# Altium footprint library Team Starcraft.PcbLib: 62 footprints (part 3 of 4)
Each footprint in its own frame and in the unit in brackets; x right, y up, seen from the top. Pads: shape width x height; smd on the part's side, far side on the other; paste and mask are expansions set on the pad; w line width, h text height; cw(c..) or ccw(c..) is an arc to the next point about the centre after c.
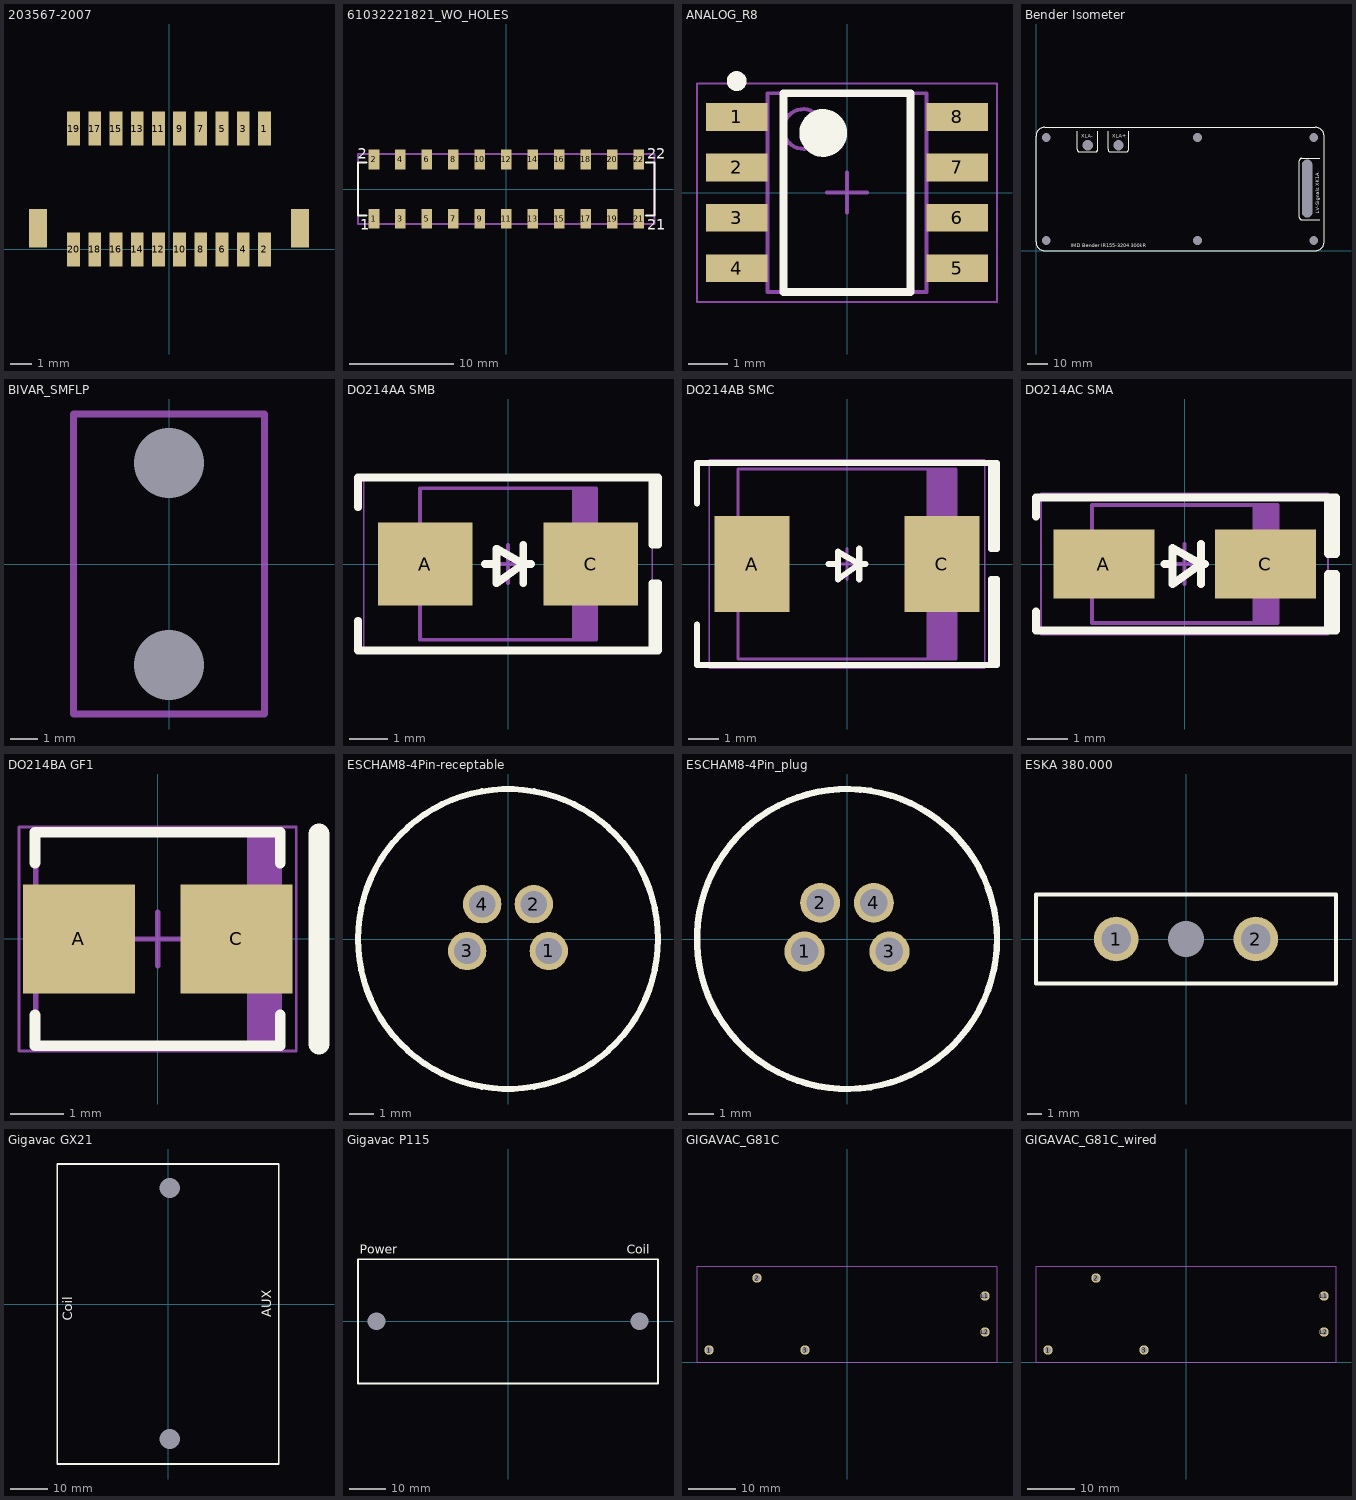
[diagram p2: the footprints below, top view; thin cyan lines are the x and y axes]

## 203567-2007 [mm] "1.00mm Pitch Pico-Clasp Wire-to-Board Header, Surface Mount, Dual Row, Right-Angle, 0.76µm Gold Plated, with Inner Positive Lock, 20 Circuits"
height 8.25
pads (22):
  rect 0.6x1.6 smd: 1(4.5,5.7) 2(4.5,0) 3(3.5,5.7) 4(3.5,0) 5(2.5,5.7) 6(2.5,0) 7(1.5,5.7) 8(1.5,0) 9(0.5,5.7) 10(0.5,0) 11(-0.5,5.7) 12(-0.5,0) 13(-1.5,5.7) 14(-1.5,0) 15(-2.5,5.7) 16(-2.5,0) 17(-3.5,5.7) 18(-3.5,0) 19(-4.5,5.7) 20(-4.5,0)
  rect 0.85x1.8 smd: ""(-6.175,1) ""(6.175,1)
3D body "2035672007.stp": height 8.23, standoff -0.02, extent -6.5,-0.45 6.5,6.05

## 61032221821_WO_HOLES [mm] "Dual SMT Socket Header, pitch 2.54mm, 22p, without holes"
height 7.45
pads (22):
  rect 1.02x1.9 smd: 1(-12.7,-2.85) 2(-12.7,2.85) 3(-10.16,-2.85) 4(-10.16,2.85) 5(-7.62,-2.85) 6(-7.62,2.85) 7(-5.08,-2.85) 8(-5.08,2.85) 9(-2.54,-2.85) 10(-2.54,2.85) 11(0,-2.85) 12(0,2.85) 13(2.54,-2.85) 14(2.54,2.85) 15(5.08,-2.85) 16(5.08,2.85) 17(7.62,-2.85) 18(7.62,2.85) 19(10.16,-2.85) 20(10.16,2.85) 21(12.7,-2.85) 22(12.7,2.85)
Top Overlay:
  lines w0.2: -13.41,-2.54 -14.22,-2.54 -14.22,2.54 -13.41,2.54 ; 13.41,-2.54 14.22,-2.54 14.22,2.54 13.41,2.54
  text "2" at -14.23,2.9 h1.02
  text "1" at -14.03,-3.9 h1.02
  text "21" at 13.53,-3.9 h1.02
  text "22" at 13.53,2.9 h1.02
Mechanical 13:
  lines w0.2: -14.22,-3.35 -14.22,3.35 14.22,3.35 14.22,-3.35 -14.22,-3.35
3D body "61032221821.stp": height 8.52, standoff 0.02, extent -13.97,-3.35 13.97,3.35

## ANALOG_R8 [mm] "Analog Devices 8-Lead Standard Small Outline Package [SOIC_N]"
height 1.75
pads (8):
  rect 1.55x0.7 smd: 1(-2.775,1.905) 2(-2.775,0.635) 3(-2.775,-0.635) 4(-2.775,-1.905) 5(2.775,-1.905) 6(2.775,-0.635) 7(2.775,0.635) 8(2.775,1.905)
Top Overlay:
  circle w0.6: c-0.6,1.5 r0.3
  circle w0.25: c-2.775,2.805 r0.125
  lines w0.2: -1.6,-2.5 1.6,-2.5 1.6,2.5 -1.6,2.5 -1.6,-2.5
Mechanical 13:
  circle w0.1: c-1.1,1.6 r0.5
  lines w0.1: -2,-2.5 2,-2.5 2,2.5 -2,2.5 -2,-2.5
Mechanical 15:
  lines w0.05: -3.775,-2.75 3.775,-2.75 3.775,2.75 -3.775,2.75 -3.775,-2.75
  lines w0.1: -0.5,0 0.5,0 ; 0,-0.5 0,0.5
3D body "SOIC8 CAN-Transciever.step": height 1.75, standoff 0, extent -3.1,-2.5 3.1,2.5

## Bender Isometer [mm] "Placeholder for Bender Isometer"
pads (9):
  round 1.524 hole 4.2 unplated: ""(5,5) ""(5,55) ""(78.5,5) ""(78.5,55) ""(135,5) ""(135,55)
  round 1.524 hole 5 square unplated: ""(25.1,51.3) ""(40.1,51.3)
  round 1.524 hole 5 slot 28 at 90 deg unplated: ""(131.8,30.2)
Top Overlay:
  lines w0.254: 0,55.768 cw(c4.232,55.768) 4.232,60 135.732,60 cw(c135.732,55.732) 140,55.732 140,4.268 cw(c135.732,4.268) 135.732,0 4.268,0 cw(c4.268,4.268) 0,4.268 0,47.5 0,55.732 cw(c4.268,55.732) 4.268,60 10,60 ; 20,58 20,49.27 ccw(c21.27,49.27) 21.27,48 28.73,48 ccw(c28.73,49.27) 30,49.27 30,58 ; 35,58 35,49.27 ccw(c36.27,49.27) 36.27,48 43.73,48 ccw(c43.73,49.27) 45,49.27 45,58 ; 138,15 129.27,15 cw(c129.27,16.27) 128,16.27 128,43.73 cw(c129.27,43.73) 129.27,45 138,45
  text "IMD Bender IR155-3204 300kR" at 17,1.7 h1.75
  text "XLA+" at 37,55 h1.75
  text "XLA-" at 22,55 h1.75
  text "LV-Signals XK1A" at 137.6,18 h1.75
3D body "TSC-5E-70127-PCB-IMD.stp": height -7, standoff -20, extent 0,0 143,60
3D body: height 13, standoff 0, extent 124,-5.5 124,-5.5
3D body: height 13, standoff 0, extent 124,-6.5 124,-6.5

## BIVAR_SMFLP [mm] "SMD flexible lightpipe"
height 34.3
pads (2):
  round 0 hole 2.565: ""(0,-3.7) ""(0,3.7)
Mechanical 15:
  lines w0.254: -3.5,-5.5 -3.5,5.5 3.5,5.5 3.5,-5.5 -3.5,-5.5
3D body "SMFLP_SOCKET.step": height 8.85, standoff -3.21, extent -3.492,-5.461 3.493,5.461

## DO214AA SMB [mm] "Molded Diode, 2-Leads, Body 4.31x3.62mm, IPC Medium Density"
height 2.44
pads (2):
  rect 2.45x2.15 smd: A(-2.15,0) C(2.15,0)
Top Overlay:
  lines w0.2: -3.9,-1.475 -3.9,-2.25 3.9,-2.25 3.9,-0.5 3.75,-0.5 3.75,-2.25 ; -3.9,1.475 -3.9,2.25 3.9,2.25 3.9,0.5 3.75,0.5 3.75,2.25 ; -0.6,0 -0.3,0 ; 0.4,-0.5 0.4,0.5 ; 0.6,0 0.4,0 ; 0.4,0 -0.3,-0.5 -0.3,0.4 0.4,0
Mechanical 13:
  rectangle: 1.67,-1.97 2.285,1.97
  lines w0.1: -2.285,-1.97 -2.285,1.97 2.285,1.97 2.285,-1.97 -2.285,-1.97
Mechanical 15:
  lines w0.05: -3.75,-2.25 -3.75,2.25 3.75,2.25 3.75,-2.25 -3.75,-2.25
  lines w0.1: -0.5,0 0.5,0 ; 0,-0.5 0,0.5
3D body "SMB.STEP": height 2.4, standoff 0, extent -2.6,-1.799 2.6,1.8

## DO214AB SMC [mm] "Molded Diode, 2-Leads, Body 6.85x5.90mm, IPC Medium Density"
height 2.62
pads (2):
  rect 2.45x3.15 smd: A(-3.1,0) C(3.1,0)
Top Overlay:
  lines w0.2: -4.9,-1.975 -4.9,-3.3 4.9,-3.3 4.9,-0.5 4.7,-0.5 4.7,-3.3 ; -4.9,1.975 -4.9,3.3 4.9,3.3 4.9,0.5 4.7,0.5 4.7,3.3 ; -0.6,0 -0.3,0 ; 0.4,-0.5 0.4,0.5 ; 0.6,0 0.4,0 ; 0.4,0 -0.3,-0.5 -0.3,0.4 0.4,0
Mechanical 13:
  rectangle: 2.599,-3.11 3.555,3.11
  lines w0.1: -3.555,-3.11 3.555,-3.11 3.555,3.11 -3.555,3.11 -3.555,-3.11
Mechanical 15:
  lines w0.05: -4.5,-3.4 4.5,-3.4 4.5,3.4 -4.5,3.4 -4.5,-3.4
  lines w0.1: -0.5,0 0.5,0 ; 0,-0.5 0,0.5
3D body "SMC.STEP": height 2.6, standoff 0, extent -3.97,-2.952 3.97,2.952

## DO214AC SMA [mm] "Molded Diode, 2-Leads, Body 4.30x2.60mm, IPC Medium Density"
height 2.4
pads (2):
  rect 2.5x1.7 smd: A(-2,0) C(2,0)
Top Overlay:
  lines w0.2: -3.683,-1.175 -3.683,-1.651 3.75,-1.651 3.75,-0.254 3.556,-0.254 3.556,-1.651 ; -3.683,1.175 -3.683,1.651 3.75,1.651 3.75,0.254 3.556,0.254 3.556,1.651 ; -0.5,0 -0.3,0 ; 0.4,-0.5 0.4,0.5 ; 0.5,0 0.4,0 ; 0.4,0 -0.3,0.4 -0.3,-0.5 0.4,0
Mechanical 13:
  rectangle: 1.681,-1.46 2.3,1.46
  lines w0.1: -2.3,-1.46 -2.3,1.46 2.3,1.46 2.3,-1.46 -2.3,-1.46
Mechanical 15:
  lines w0.05: -3.556,-1.75 -3.556,1.75 3.556,1.75 3.556,-1.75 -3.556,-1.75
  lines w0.1: -0.5,0 0.5,0 ; 0,-0.5 0,0.5
3D body "SMA.STEP": height 2.4, standoff 0, extent -2.6,-1.375 2.6,1.375

## DO214BA GF1 [mm] "Molded, 2-Leads, Body 4.57x3.94mm, IPC High Density"
height 3.3
pads (2):
  rect 2.1x2.05 smd: A(-1.475,0) C(1.475,0)
Top Overlay:
  lines w0.2: -2.3,-1.425 -2.3,-2 2.3,-2 2.3,-1.425 ; -2.3,1.425 -2.3,2 2.3,2 2.3,1.425
  lines w0.4: 3.025,-1.97 3.025,1.97
Mechanical 13:
  rectangle: 1.67,-1.97 2.285,1.97
  lines w0.1: -2.285,-1.97 -2.285,1.97 2.285,1.97 2.285,-1.97 -2.285,-1.97
Mechanical 15:
  lines w0.05: -2.6,-2.1 -2.6,2.1 2.6,2.1 2.6,-2.1 -2.6,-2.1
  lines w0.1: -0.5,0 0.5,0 ; 0,-0.5 0,0.5
3D body "DIOM4336X33L.step": height 3.3, standoff 0, extent -2.505,-1.97 2.505,1.97

## ESCHAM8-4Pin-receptable [mm]
height 18.8
pads (4):
  round 1.6 hole 1.1: 1(1.7,-0.5) 2(1.075,1.45) 3(-1.7,-0.5) 4(-1.075,1.45)
Top Overlay:
  circle w0.254: c0,0 r6.25
3D body "AL-FHM8KUA4P_M10.stp": height 2, standoff -16.8, extent -6,-6.25 6,6.25
3D body: height 0, standoff 0, extent -5.999,-5.999 5.999,5.999

## ESCHAM8-4Pin_plug [mm]
height 17.9
pads (4):
  round 1.6 hole 1.1: 1(-1.7,-0.5) 2(-1.075,1.45) 3(1.7,-0.5) 4(1.075,1.45)
Top Overlay:
  circle w0.254: c0,0 r6
3D body: height 0, standoff 0, extent -5.999,-5.999 5.999,5.999
3D body "AL-FHM8SUA4P_M8.stp": height 17.9, standoff -3, extent -6,-6.25 6,6.25

## ESKA 380.000 [mm] "Socket for automotive fuses"
height 27.6
pads (3):
  round 3 hole 2: 1(-4.7,0) 2(4.7,0)
  round 0 hole 2.4 unplated: ""(0,0)
Top Overlay:
  lines w0.254: -10.1,-3 10.1,-3 10.1,3 -10.1,3 -10.1,-3
3D body: height 21.1, standoff 0, extent -10.1,-3 10.1,3
3D body: height 27.6, standoff 21.1, extent -8.89,-2.286 8.89,2.286

## Gigavac GX21 [mm]
pads (2):
  round 0 hole 5.5 unplated: ""(0.5,-36.5) ""(0.5,31.5)
Top Overlay:
  lines w0.5: -30,-43.3 30,-43.3 30,-22.05 30,16.45 30,38 -30,38 -30,-43.3 ; -30,26.7 -30,36.7 -30,26.7
  text "Coil" at -26,-4.5 h2.54
  text "AUX" at 28,-3.5 h2.54
3D body: height 1.6, standoff -0.05, extent 1,-3.3 1,-3.3
3D body: height 1.6, standoff -0.05, extent 1,-3.3 1,-3.3
3D body "GX21_step_121715.STEP": height 182, standoff 0, extent -29.916,-57.668 29.916,37.668
3D body: height 1.6, standoff -0.05, extent 7.8,-3.3 7.8,-3.3
3D body: height 1.6, standoff -0.05, extent 1.5,-3.3 1.5,-3.3

## Gigavac P115 [mm]
pads (2):
  round 0 hole 4.8 unplated: ""(-35.95,0) ""(35.95,0)
Top Overlay:
  lines w0.5: -41,-17 -41,17 41,17 41,-17 -41,-17
  text "Coil" at 32.5,18.5 h2.54
  text "Power" at -40.5,18.5 h2.54
3D body "P115_step_091914.STEP": height 53.84, standoff -0.1, extent -40.64,-16.568 40.64,16.568

## GIGAVAC_G81C [mm]
height 18.5
pads (5):
  round 2 hole 1.2: 1(-29.21,2.54) 2(-19.05,17.78) 3(-8.89,2.54) L1(29.21,13.97) L2(29.21,6.35)
Mechanical 15:
  lines w0.1: -31.75,0 31.75,0 31.75,20.32 -31.75,20.32 -31.75,0
3D body "G81CX35_step_082112.STEP": height 19.3, standoff -3, extent -31.75,0.26 31.75,20.06

## GIGAVAC_G81C_wired [mm]
height 18.5
pads (5):
  round 2 hole 1.2: 1(-29.21,2.54) 2(-19.05,17.78) 3(-8.89,2.54) L1(29.21,13.97) L2(29.21,6.35)
Mechanical 15:
  lines w0.1: -31.75,0 31.75,0 31.75,20.32 -31.75,20.32 -31.75,0
3D body "G81C_step_020415.STEP": height 177.3, standoff -3, extent -31.75,0.26 31.75,20.06